# Altium footprint library Custom_Library.PcbLib: 221 footprints (part 2 of 14)
Each footprint in its own frame and in the unit in brackets; x right, y up, seen from the top. Pads: shape width x height; smd on the part's side, far side on the other; paste and mask are expansions set on the pad; w line width, h text height; cw(c..) or ccw(c..) is an arc to the next point about the centre after c.
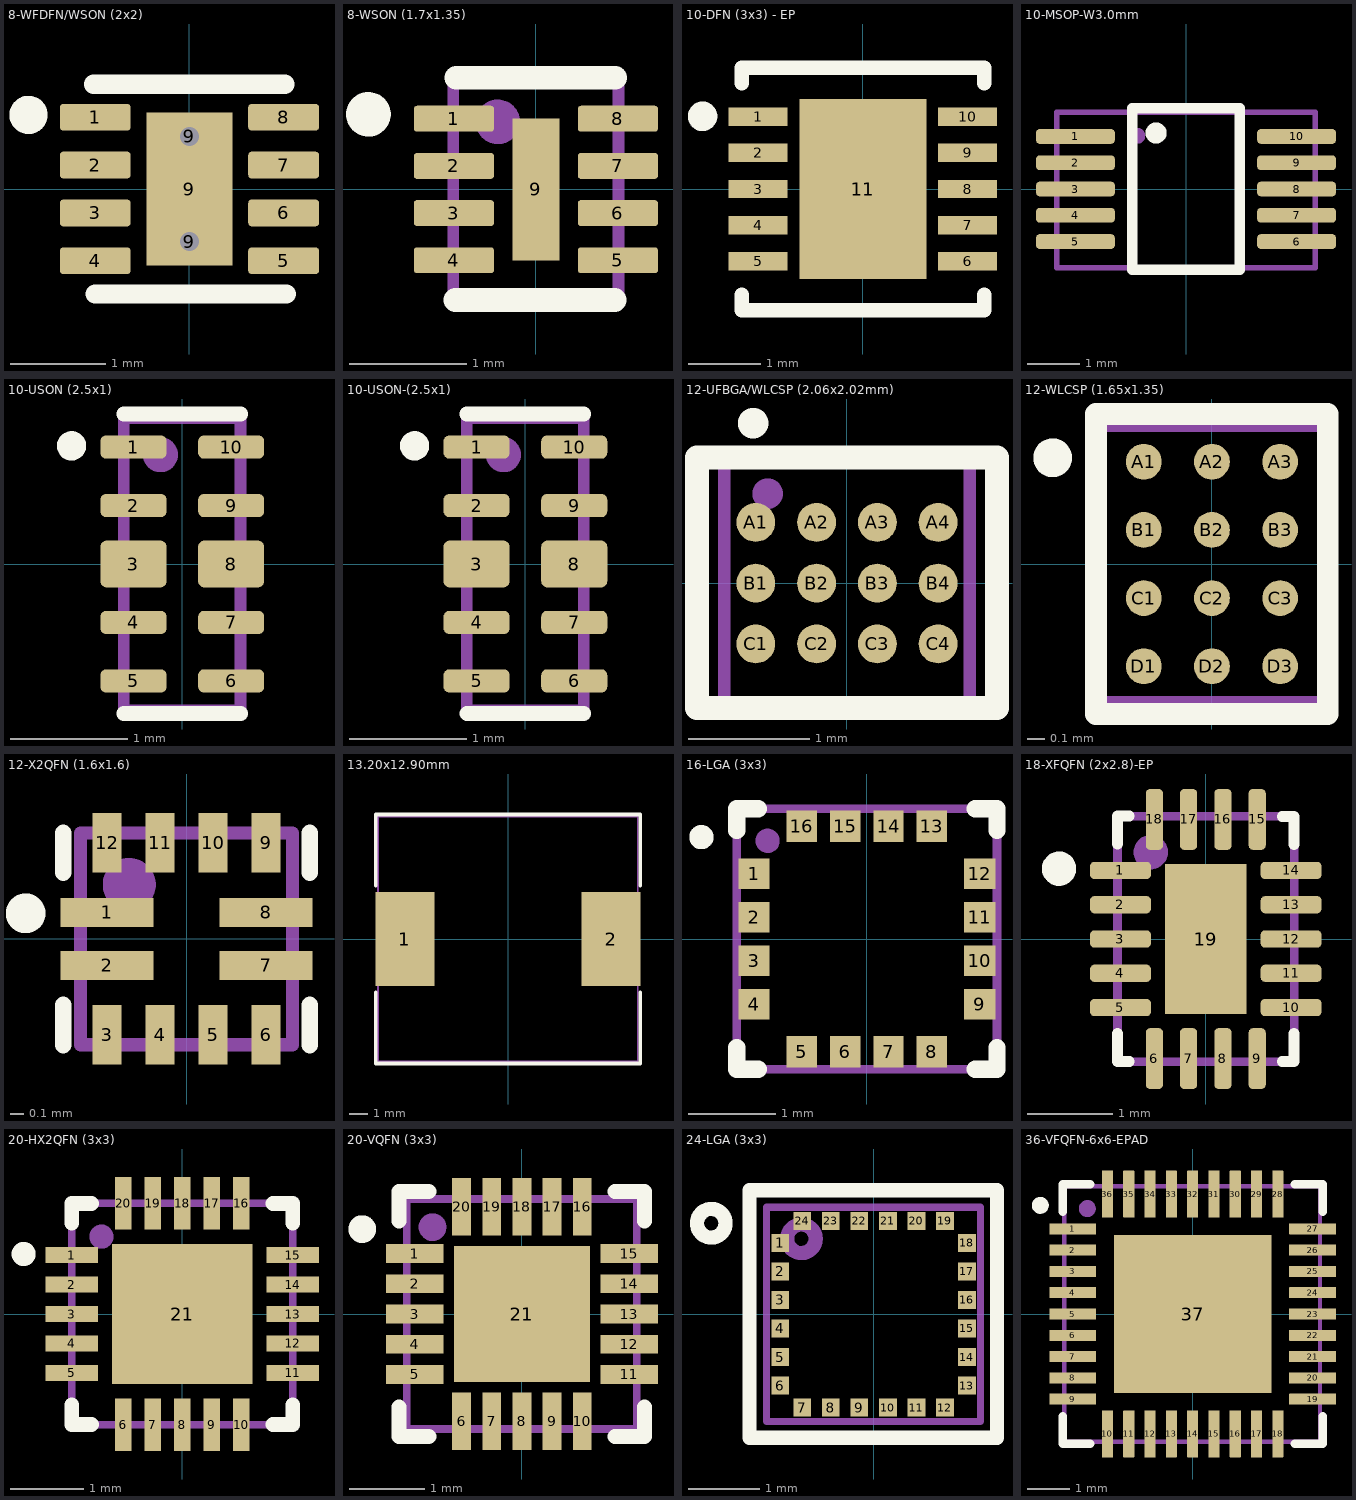
[diagram p1: the footprints below, top view; thin cyan lines are the x and y axes]

## 8-WFDFN/WSON (2x2) [mm]
pads (11):
  rrect25% 0.74x0.28 smd: 1(-0.985,0.751) 2(-0.985,0.251) 3(-0.985,-0.249) 4(-0.985,-0.749) 5(0.985,-0.749) 6(0.985,-0.249) 7(0.985,0.251) 8(0.985,0.751)
  round 0.4 hole 0.2 mask+0: 9(0,-0.549) 9(0,0.551)
  rect 0.9x1.6 smd paste-2: 9(0,0.001)
Top Overlay:
  circle w0.2: c-1.682,0.776 r0.1
  lines w0.2: -1.002,1.097 0.998,1.097 ; -0.986,-1.097 1.014,-1.097
Top Paste:
  region: 0.28,-0.509 -0.28,-0.509 -0.28,0.511 0.28,0.511
3D body "step_temp.STEP": height 0.8, standoff 0, extent -1,-0.999 1,1.001

## 8-WSON (1.7x1.35) [mm]
pads (9):
  rrect25% 0.68x0.22 smd: 1(-0.695,0.6) 2(-0.695,0.2) 3(-0.695,-0.2) 4(-0.695,-0.6) 5(0.695,-0.6) 6(0.695,-0.2) 7(0.695,0.2) 8(0.695,0.6)
  rect 0.4x1.2 smd paste-2 mask+0.152: 9(0,0)
Top Overlay:
  circle w0.2: c-1.419,0.637 r0.089
  lines w0.2: -0.682,-0.937 0.668,-0.937 ; -0.676,0.948 0.674,0.948
Top Paste:
  region: 0.13,-0.38 -0.13,-0.38 -0.13,0.38 0.13,0.38
Top Assembly:
  circle w0.2: c-0.323,0.573 r0.089
  lines w0.1: -0.7,-0.937 0.7,-0.937 0.7,0.948 -0.626,0.948 -0.7,0.948 -0.7,-0.937
  text "'.Designator'" at -3.103,-2.208 h1.27
3D body "TPD8E003DQDR--3DModel-STEP-56544.STEP": height 0.75, standoff -0.05, extent -0.675,-0.85 0.675,0.85

## 10-DFN (3x3) - EP [mil]
pads (11):
  rect 32x10 smd mask+2: 1(-57,39.37) 2(-57,19.68) 3(-57,0) 4(-57,-19.68) 5(-57,-39.37) 6(57,-39.37) 7(57,-19.68) 8(57,0) 9(57,19.68) 10(57,39.37)
  rect 69x98 smd mask+2: 11(0,0)
Top Overlay:
  circle w10: c-87.25,39.55 r3.01
  lines w7.87: -66,-57.47 -66,-66 66,-66 66,-57.47 ; -66,57.47 -66,66 66,66 66,57.47
3D body: height 10, standoff 0, extent 0,0 10,10

## 10-MSOP-W3.0mm [mm]
pads (10):
  rrect50% 1.5x0.28 smd: 1(-2.105,1) 2(-2.105,0.5) 3(-2.105,0) 4(-2.105,-0.5) 5(-2.105,-1) 6(2.105,-1) 7(2.105,-0.5) 8(2.105,0) 9(2.105,0.5) 10(2.105,1)
Top Overlay:
  circle w0.2: c-0.57,1.066 r0.1
  lines w0.2: -1.022,-1.532 1.022,-1.532 1.022,1.459 1.022,1.532 -1.022,1.532 -1.022,-1.532
Top Assembly:
  circle w0.2: c-0.926,1.012 r0.05
  lines w0.1: -1.077,1.459 1.022,1.459 ; -2.461,-1.498 -2.461,1.459 -1.714,1.459 2.462,1.459 2.462,-1.498 -2.461,-1.498
  text "'.Designator'" at -3.403,-2.708 h1.27
3D body "msop-10.STEP": height 1.15, standoff 0, extent -2.45,-1.5 2.45,1.5

## 10-USON (2.5x1) [mm]
pads (10):
  rrect50% 0.565x0.2 smd mask+0: 1(-0.417,1) 2(-0.417,0.5) 4(-0.417,-0.5) 5(-0.417,-1) 6(0.417,-1) 7(0.417,-0.5) 9(0.417,0.5) 10(0.417,1)
  rrect25% 0.565x0.4 smd paste-1 mask+0: 3(-0.417,0) 8(0.417,0)
Top Overlay:
  circle w0.15: c-0.948,1.01 r0.05
  lines w0.127: -0.501,1.283 0.499,1.283 ; -0.501,-1.279 0.499,-1.279
Top Paste:
  drawing of 2 lines, arcs and shapes, not listed
Top Solder:
  region: 0.77,-0.27 0.065,-0.27 0.065,0.27 0.77,0.27
  region: -0.065,-0.27 -0.77,-0.27 -0.77,0.27 -0.065,0.27
  region: 0.77,-1.17 0.065,-1.17 0.065,-0.83 0.77,-0.83
  region: 0.77,-0.67 0.065,-0.67 0.065,-0.33 0.77,-0.33
  region: 0.77,0.33 0.065,0.33 0.065,0.67 0.77,0.67
  region: 0.77,0.83 0.065,0.83 0.065,1.17 0.77,1.17
  region: -0.065,-1.17 -0.77,-1.17 -0.77,-0.83 -0.065,-0.83
  region: -0.065,-0.67 -0.77,-0.67 -0.77,-0.33 -0.065,-0.33
  region: -0.065,0.33 -0.77,0.33 -0.77,0.67 -0.065,0.67
  region: -0.065,0.83 -0.77,0.83 -0.77,1.17 -0.065,1.17
Top Assembly:
  circle w0.2: c-0.188,0.935 r0.05
  lines w0.1: -0.5,-1.249 0.498,-1.249 0.498,1.247 -0.131,1.247 -0.5,1.247 -0.5,-1.249
  text "'.Designator'" at -3.275,-2.453 h1.27
3D body "TPD4EUSB30DQAR.STEP": height 0.55, standoff 0, extent -0.5,-1.25 0.5,1.25

## 10-USON-(2.5x1) [mm]
pads (10):
  rrect50% 0.565x0.2 smd paste+0.1 mask+0.06: 1(-0.417,1)
  rrect50% 0.565x0.2 smd paste+0 mask+0.06: 2(-0.417,0.5) 4(-0.417,-0.5) 5(-0.417,-1) 6(0.417,-1) 7(0.417,-0.5) 9(0.417,0.5) 10(0.417,1)
  rrect25% 0.565x0.4 smd paste+0 mask+0.06: 3(-0.417,0) 8(0.417,0)
Top Overlay:
  circle w0.15: c-0.948,1.01 r0.05
  lines w0.127: -0.501,1.283 0.499,1.283 ; -0.501,-1.279 0.499,-1.279
Top Paste:
  drawing of 2 lines, arcs and shapes, not listed
Top Assembly:
  circle w0.2: c-0.188,0.935 r0.05
  lines w0.1: -0.5,-1.249 0.498,-1.249 0.498,1.247 -0.131,1.247 -0.5,1.247 -0.5,-1.249
  text "'.Designator'" at -3.275,-2.453 h1.27
3D body "TPD4EUSB30DQAR.STEP": height 0.55, standoff 0, extent -0.5,-1.25 0.5,1.25

## 12-UFBGA/WLCSP (2.06x2.02mm) [mm]
pads (12):
  round 0.32 smd: A1(-0.75,0.5) A2(-0.25,0.5) A3(0.25,0.5) A4(0.75,0.5) B1(-0.75,0) B2(-0.25,0) B3(0.25,0) B4(0.75,0) C1(-0.75,-0.5) C2(-0.25,-0.5) C3(0.25,-0.5) C4(0.75,-0.5)
Top Overlay:
  circle w0.2: c-0.773,1.316 r0.025
  lines w0.2: -1.234,-1.027 1.235,-1.027 1.235,1.033 -0.714,1.033 -1.234,1.033 -1.234,-1.027
Top Assembly:
  circle w0.2: c-0.653,0.736 r0.025
  lines w0.1: -1.01,-1.027 1.01,-1.027 1.01,1.033 -1.01,1.033 -1.01,-1.027
  text "'.Designator'" at -3.331,-1.996 h1.27

## 12-WLCSP (1.65x1.35) [mm]
pads (12):
  round 0.21 smd: A1(-0.4,0.6) A2(0,0.6) A3(0.4,0.6) B1(-0.4,0.2) B2(0,0.2) B3(0.4,0.2) C1(-0.4,-0.2) C2(0,-0.2) C3(0.4,-0.2) D1(-0.4,-0.6) D2(0,-0.6) D3(0.4,-0.6)
Top Overlay:
  circle w0.127: c-0.935,0.623 r0.05
  lines w0.127: -0.68,-0.88 0.68,-0.88 0.68,0.88 -0.68,0.88 -0.68,-0.88
Top Assembly:
  lines w0.1: -0.675,-0.825 -0.675,0.825 0.675,0.825 0.675,-0.825 -0.675,-0.825
  text "'.Designator'" at -2.918,-2.018 h1.27
3D body "NX5P3090UKZ--3DModel-STEP-56544.STEP": height 0.57, standoff 0, extent -0.682,-0.826 0.669,0.824

## 12-X2QFN (1.6x1.6) [mm]
pads (12):
  rect 0.7x0.22 smd paste-1 mask+0: 1(-0.6,0.2) 2(-0.6,-0.2) 7(0.6,-0.2) 8(0.6,0.2)
  rect 0.22x0.45 smd paste-1 mask+0: 3(-0.6,-0.725) 4(-0.2,-0.725) 5(0.2,-0.725) 6(0.6,-0.725) 9(0.6,0.725) 10(0.2,0.725) 11(-0.2,0.725) 12(-0.6,0.725)
Top Overlay:
  circle w0.2: c-1.215,0.193 r0.05
  lines w0.127: -0.93,-0.8 -0.93,-0.5 ; -0.93,0.5 -0.93,0.8 ; 0.93,-0.8 0.93,-0.5 ; 0.93,0.5 0.93,0.8
Top Paste:
  region: -0.51,-0.531 -0.691,-0.531 -0.691,0.13 -0.51,0.13
  region: -0.51,-0.13 -0.691,-0.13 -0.691,0.53 -0.51,0.53
  region: 0.69,-0.13 0.511,-0.13 0.511,0.53 0.69,0.53
  region: 0.69,-0.531 0.511,-0.531 0.511,0.13 0.69,0.13
  region: 0.29,-0.93 0.11,-0.93 0.11,-0.52 0.29,-0.52
  region: -0.11,-0.931 -0.29,-0.931 -0.29,-0.52 -0.11,-0.52
  region: -0.51,-0.93 -0.69,-0.93 -0.69,-0.52 -0.51,-0.52
  region: 0.29,0.521 0.11,0.521 0.11,0.93 0.29,0.93
  region: -0.11,0.52 -0.29,0.52 -0.29,0.93 -0.11,0.93
  region: -0.51,0.521 -0.691,0.521 -0.691,0.93 -0.51,0.93
  region: 0.69,0.52 0.51,0.52 0.51,0.93 0.69,0.93
  region: 0.69,-0.93 0.51,-0.93 0.51,-0.52 0.69,-0.52
Top Solder:
  region: 0.75,-1.002 0.451,-1.002 0.451,-0.45 0.75,-0.45
  region: 0.35,-1.001 0.05,-1.001 0.05,-0.45 0.35,-0.45
  region: -0.05,-1 -0.35,-1 -0.35,-0.45 -0.05,-0.45
  region: -0.45,-1 -0.75,-1 -0.75,-0.45 -0.45,-0.45
  region: -0.2,-0.361 -1.001,-0.361 -1.001,-0.04 -0.2,-0.04
  region: 1,-0.36 0.2,-0.36 0.2,-0.04 1,-0.04
  region: 1,0.04 0.2,0.04 0.2,0.36 1,0.36
  region: -0.2,0.04 -1.001,0.04 -1.001,0.36 -0.2,0.36
  region: 0.75,0.45 0.45,0.45 0.45,1 0.75,1
  region: 0.35,0.45 0.05,0.45 0.05,1 0.35,1
  region: -0.05,0.451 -0.351,0.451 -0.351,1 -0.05,1
  region: -0.45,0.45 -0.751,0.45 -0.751,1 -0.45,1
Top Assembly:
  circle w0.2: c-0.432,0.41 r0.1
  lines w0.1: -0.8,-0.8 -0.8,0.8 0.8,0.8 0.8,-0.8 -0.8,-0.8
  text "'.Designator'" at -3.017,-2.054 h1.27
3D body: height 0.5, standoff 0, extent -0.8,-0.8 0.8,0.8

## 13.20x12.90mm [mil]
pads (2):
  rect 123x195 smd paste+0 mask+7: 1(-214.5,0) 2(214.5,0)
Top Overlay:
  lines w7.87: -275,-110.6 -275,-259 275,-259 275,-110.6 ; -275,110.6 -275,259 275,259 275,110.6
Top Assembly:
  lines w3.94: -270.49,-254.17 269.89,-254.17 269.89,254.64 46.43,254.64 -270.49,254.64 -270.49,-254.17
  text "'.Designator'" at -127.7,-23.21 h50
3D body: height 10, standoff 0, extent 0,0 10,10
3D body "IND_IHLP-5050EZ_VIS.step": height 199.02, standoff 0, extent -270,-254.02 270,254.02

## 16-LGA (3x3) [mm]
pads (16):
  rect 0.36x0.35 smd: 1(-1.3,0.75) 2(-1.3,0.25) 3(-1.3,-0.25) 4(-1.3,-0.75) 9(1.3,-0.75) 10(1.3,-0.25) 11(1.3,0.25) 12(1.3,0.75)
  rect 0.35x0.36 smd: 5(-0.75,-1.3) 6(-0.25,-1.3) 7(0.25,-1.3) 8(0.75,-1.3) 13(0.75,1.3) 14(0.25,1.3) 15(-0.25,1.3) 16(-0.75,1.3)
Top Overlay:
  circle w0.178: c-1.907,1.174 r0.051
  lines w0.2: -1.5,-1.25 -1.5,-1.5 -1.25,-1.5 ; -1.5,1.25 -1.5,1.5 -1.25,1.5 ; 1.25,-1.5 1.5,-1.5 1.5,-1.25 ; 1.25,1.5 1.5,1.5 1.5,1.25
Top Assembly:
  circle w0.178: c-1.144,1.132 r0.051
  lines w0.1: -1.5,-1.5 -1.5,1.5 -1.4,1.5 1.5,1.5 1.5,-1.5 -1.5,-1.5
  text "'.Designator'" at -3.244,-2.69 h1.27

## 18-XFQFN (2x2.8)-EP [mm]
pads (19):
  rrect50% 0.71x0.2 smd: 1(-0.995,0.8) 2(-0.995,0.4) 3(-0.995,0) 4(-0.995,-0.4) 5(-0.995,-0.8) 10(0.995,-0.8) 11(0.995,-0.4) 12(0.995,0) 13(0.995,0.4) 14(0.995,0.8)
  rrect50% 0.2x0.71 smd: 6(-0.6,-1.395) 7(-0.2,-1.395) 8(0.2,-1.395) 9(0.6,-1.395) 15(0.6,1.395) 16(0.2,1.395) 17(-0.2,1.395) 18(-0.6,1.395)
  rect 0.95x1.75 smd paste-2: 19(0,0)
Top Overlay:
  circle w0.2: c-1.712,0.82 r0.1
  lines w0.127: -1.03,-1.102 -1.03,-1.429 -0.892,-1.429 ; -1.03,1.11 -1.03,1.436 -0.892,1.436 ; 0.892,-1.429 1.03,-1.429 1.03,-1.102 ; 0.892,1.429 1.03,1.429 1.03,1.102
Top Paste:
  region: 0.3,0.06 -0.3,0.06 -0.3,0.66 0.3,0.66
  region: 0.3,-0.66 -0.3,-0.66 -0.3,-0.06 0.3,-0.06
Top Assembly:
  circle w0.2: c-0.642,1.013 r0.1
  lines w0.1: -1.03,-1.43 -1.03,1.43 1.03,1.43 1.03,-1.43 -1.03,-1.43
  text "'.Designator'" at -3.344,-2.79 h1.27
3D body: height 0.5, standoff 0, extent -1.03,-1.43 1.03,1.43

## 20-HX2QFN (3x3) [mm]
pads (21):
  rect 0.71x0.22 smd mask+0.064: 1(-1.5,0.8) 2(-1.5,0.4) 3(-1.5,0) 4(-1.5,-0.4) 5(-1.5,-0.8) 11(1.5,-0.8) 12(1.5,-0.4) 13(1.5,0) 14(1.5,0.4) 15(1.5,0.8)
  rect 0.22x0.71 smd mask+0.064: 6(-0.8,-1.5) 7(-0.4,-1.5) 8(0,-1.5) 9(0.4,-1.5) 10(0.8,-1.5) 16(0.8,1.5) 17(0.4,1.5) 18(0,1.5) 19(-0.4,1.5) 20(-0.8,1.5)
  rect 1.9x1.9 smd paste-2 mask+0.064: 21(0,0)
Top Overlay:
  circle w0.2: c-2.151,0.814 r0.064
  lines w0.2: -1.5,-1.23 -1.5,-1.5 -1.23,-1.5 ; -1.5,1.23 -1.5,1.5 -1.23,1.5 ; 1.23,-1.5 1.5,-1.5 1.5,-1.23 ; 1.23,1.5 1.5,1.5 1.5,1.23
Top Paste:
  region: 0.6,-0.6 -0.6,-0.6 -0.6,0.6 0.6,0.6
Top Assembly:
  circle w0.2: c-1.096,1.049 r0.064
  lines w0.1: -1.5,-1.5 1.5,-1.5 1.5,1.5 0.8,1.5 -1.5,1.5 -1.5,-1.5
  text "'.Designator'" at -3.644,-2.89 h1.27
3D body "SE050C2HQ1-Z01SDZ--3DModel-STEP-56544.STEP": height 0.33, standoff 0, extent -1.5,-1.5 1.5,1.5

## 20-VQFN (3x3) [mil]
pads (21):
  rect 30x9.84 smd paste+0 mask+1.97: 1(-56,31.5) 2(-56,15.75) 3(-56,0) 4(-56,-15.75) 5(-56,-31.5) 11(56,-31.5) 12(56,-15.75) 13(56,0) 14(56,15.75) 15(56,31.5)
  rect 9.84x30 smd paste+0 mask+1.97: 6(-31.5,-56) 7(-15.75,-56) 8(0,-56) 9(15.75,-56) 10(31.5,-56) 16(31.5,56) 17(15.75,56) 18(0,56) 19(-15.75,56) 20(-31.5,56)
  rect 71x71 smd paste+0 mask+1.97: 21(0,0)
Top Overlay:
  circle w10: c-83.28,44.28 r2.21
  lines w7.87: -64,-48.6 -64,-64 -48.6,-64 ; -64,48.6 -64,64 -48.6,64 ; 48.6,-64 64,-64 64,-48.6 ; 48.6,64 64,64 64,48.6
Top Assembly:
  circle w10: c-46.65,45.31 r2.21
  lines w3.94: -60,-60 60,-60 60,60 -40,60 -60,60 -60,-60
  text "'.Designator'" at -139.51,-105.89 h50
3D body: height 10, standoff 0, extent 0,0 10,10
3D body "VQFN20_3X3_MCH.step": height 23.11, standoff 0, extent -58.92,-58.91 59.1,59.12

## 24-LGA (3x3) [mm]
pads (24):
  rect 0.25x0.25 smd: 1(-1.308,1) 2(-1.308,0.6) 3(-1.308,0.2) 4(-1.308,-0.2) 5(-1.308,-0.6) 6(-1.308,-1) 7(-1,-1.308) 8(-0.6,-1.308) 9(-0.2,-1.308) 10(0.2,-1.308) 11(0.6,-1.308) 12(1,-1.308) 13(1.308,-1) 14(1.308,-0.6) 15(1.308,-0.2) 16(1.308,0.2) 17(1.308,0.6) 18(1.308,1) 19(1,1.308) 20(0.6,1.308) 21(0.2,1.308) 22(-0.2,1.308) 23(-0.6,1.308) 24(-1,1.308)
Top Overlay:
  circle w0.2: c-2.275,1.275 r0.2
  lines w0.2: -1.74,-1.73 0.8,-1.73 1.73,-1.73 1.73,0.93 1.73,1.736 -1.74,1.736 -1.74,1.7 -1.74,-0.06 -1.74,-1.73
Top Assembly:
  circle w0.2: c-1.012,1.058 r0.2
  lines w0.1: -1.5,-1.504 -0.404,-1.504 1.5,-1.504 1.5,1.5 -1.5,1.5 -1.5,0.8 -1.5,-1.504
  text "'.Designator'" at -3.242,-2.804 h1.27
3D body "QFN_BHI160_BOS.step": height 0.99, standoff 0, extent -1.499,-1.499 1.499,1.499
3D body: height 0.25, standoff 0, extent -0.254,0 0,0.254

## 36-VFQFN-6x6-EPAD [mm]
pads (37):
  rrect7% 1.1x0.26 smd: 1(-2.815,2) 2(-2.815,1.5) 3(-2.815,1) 4(-2.815,0.5) 5(-2.815,0) 6(-2.815,-0.5) 7(-2.815,-1) 8(-2.815,-1.5) 9(-2.815,-2) 19(2.815,-2) 20(2.815,-1.5) 21(2.815,-1) 22(2.815,-0.5) 23(2.815,0) 24(2.815,0.5) 25(2.815,1) 26(2.815,1.5) 27(2.815,2)
  rrect7% 0.26x1.1 smd: 10(-2,-2.815) 11(-1.5,-2.815) 12(-1,-2.815) 13(-0.5,-2.815) 14(0,-2.815) 15(0.5,-2.815) 16(1,-2.815) 17(1.5,-2.815) 18(2,-2.815) 28(2,2.815) 29(1.5,2.815) 30(1,2.815) 31(0.5,2.815) 32(0,2.815) 33(-0.5,2.815) 34(-1,2.815) 35(-1.5,2.815) 36(-2,2.815)
  rect 3.7x3.7 smd paste-3: 37(0,0)
Top Overlay:
  circle w0.2: c-3.578,2.552 r0.1
  lines w0.2: -3.05,-2.4 -3.05,-3.05 -2.4,-3.05 ; -3.05,2.4 -3.05,3.05 -2.4,3.05 ; 2.4,-3.05 3.05,-3.05 3.05,-2.4 ; 2.4,3.05 3.05,3.05 3.05,2.4
Top Paste:
  region: -0.18,-1.49 -1.49,-1.49 -1.49,-0.18 -0.18,-0.18
  region: 1.49,-1.49 0.18,-1.49 0.18,-0.18 1.49,-0.18
  region: 1.49,0.18 0.18,0.18 0.18,1.49 1.49,1.49
  region: -0.18,0.18 -1.49,0.18 -1.49,1.49 -0.18,1.49
Top Assembly:
  circle w0.2: c-2.475,2.475 r0.1
  lines w0.1: -3.013,-2.999 2.987,-2.999 2.987,3.001 -3.013,3.001 -3.013,-2.999
  text "'.Designator'" at -3.1,-4.76 h1.27
3D body: height 0.6, standoff 0, extent -3.013,-2.999 2.987,3.001